# Altium footprint library THD Passive Components.PcbLib: 72 footprints (part 5 of 5)
Each footprint in its own frame and in the unit in brackets; x right, y up, seen from the top. Pads: shape width x height; smd on the part's side, far side on the other; paste and mask are expansions set on the pad; w line width, h text height; cw(c..) or ccw(c..) is an arc to the next point about the centre after c.
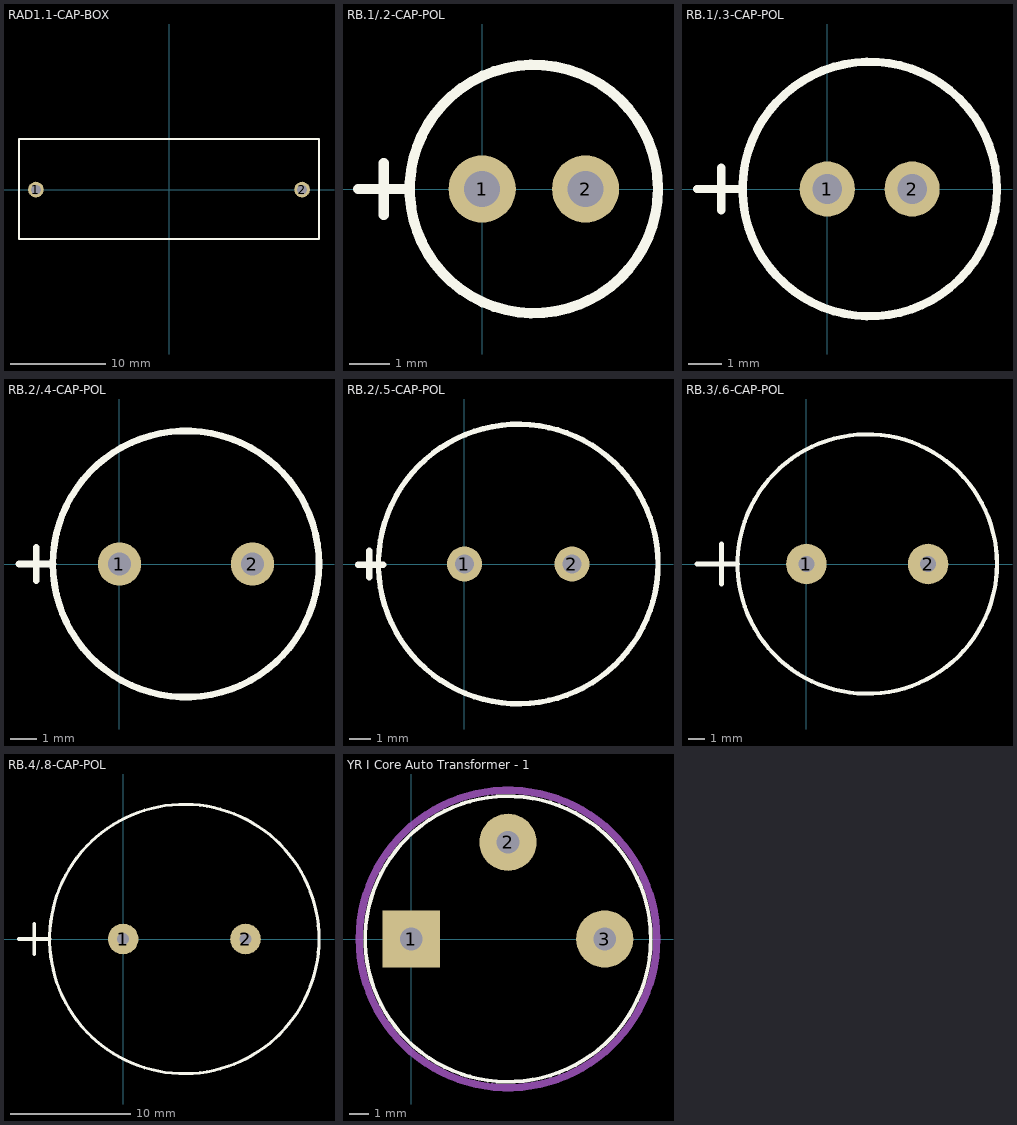
[diagram p4: the footprints below, top view; thin cyan lines are the x and y axes]

## RAD1.1-CAP-BOX [mm] "Axial Device, Thru-Hole; 2 Leads; 1.0 in Pin Spacing"
height 7.62
pads (2):
  round 1.65 hole 1.016: 1(-13.97,0) 2(13.97,0)
Top Overlay:
  lines w0.2: -15.748,-5.207 15.748,-5.207 15.748,5.334 -15.748,5.334 -15.748,-5.207
3D body "THD Cap Rad Box P27.94mm WLH11x31.5x21mm YEL.STEP": height 20.75, standoff -3.91, extent -15.75,-5.207 15.75,5.294

## RB.1/.2-CAP-POL [mil]
pads (2):
  round 65 hole 35: 1(0,0) 2(100,0)
Top Overlay:
  circle w10: c50,0 r120
  lines w10: -120,0 -70,0 ; -95,-25 -95,25
3D body "THD Cap Rad Pol PDH2.54x6.3x11mm.STEP": height 444.57, standoff -47.56, extent -73.99,-125 173.99,123.02

## RB.1/.3-CAP-POL [mil]
pads (2):
  round 65 hole 35: 1(0,0) 2(100,0)
Top Overlay:
  circle w10: c50,0 r150
  lines w10: -153.57,0 -103.57,0 ; -125,-25 -125,25
3D body "THD Cap Rad Pol PDH2.54x8x12mm.STEP": height 483.94, standoff -47.95, extent -107.43,-157.47 207.43,157.48

## RB.2/.4-CAP-POL [mil]
pads (2):
  round 65 hole 35: 1(0,0) 2(200,0)
Top Overlay:
  circle w10: c100,0 r200
  lines w10: -151,0 -101,0 ; -125,-25 -125,25
3D body "THD Cap Rad Pol PDH5.08x10x16mm.STEP": height 641.42, standoff -47.56, extent -96.79,-200 296.79,193.69

## RB.2/.5-CAP-POL [mil] "RB.2/.5 Electrolitic Capacitor"
pads (2):
  round 65 hole 35: 1(0,0) 2(200,0)
Top Overlay:
  circle w10: c100,0 r260
  lines w12: -198,-1 -151,-1 ; -177,-25 -177,25
3D body "THD Cap Rad Pol PDH5.08x13x21mm.STEP": height 838.27, standoff -47.56, extent -155.83,-255.9 355.82,255.9

## RB.3/.6-CAP-POL [mil]
pads (2):
  round 100 hole 40: 1(0,0) 2(300,0)
Top Overlay:
  circle w10: c150,0 r320
  lines w12: -270,0 -170,0 ; -210,-50 -210,50
3D body "THD Cap Rad Pol PDH7.62x16x31mm.STEP": height 1231.97, standoff -47.56, extent -164.84,-314.95 464.85,314.95

## RB.4/.8-CAP-POL [mil]
pads (2):
  round 100 hole 40: 1(0,0) 2(400,0)
Top Overlay:
  circle w10: c200,0 r440
  lines w12: -340,0 -240,0 ; -290,-50 -290,50
3D body "THD Cap Rad Pol PDH10.1x22x35mm.STEP": height 1389.45, standoff -47.56, extent -232.91,-433.07 632.92,433.04

## YR I Core Auto Transformer - 1 [mm]
pads (3):
  rect 3x3 hole 1.2: 1(0,0)
  round 3 hole 1.2: 2(5.08,5.08) 3(10.16,0)
Top Overlay:
  circle w0.2: c5.08,0 r7.5
Mechanical 13:
  circle w0.254: c5.079,0 r7.748
Mechanical 15:
  circle w0.254: c5.08,0 r7.878
3D body "YR I Core Auto Transformer - 1.STEP": height 15, standoff -4, extent -1.919,-7 12.079,6.998